# Altium footprint library 3.22-杂项.PcbLib: 985 footprints (part 61 of 64)
Each footprint in its own frame and in the unit in brackets; x right, y up, seen from the top. Pads: shape width x height; smd on the part's side, far side on the other; paste and mask are expansions set on the pad; w line width, h text height; cw(c..) or ccw(c..) is an arc to the next point about the centre after c.
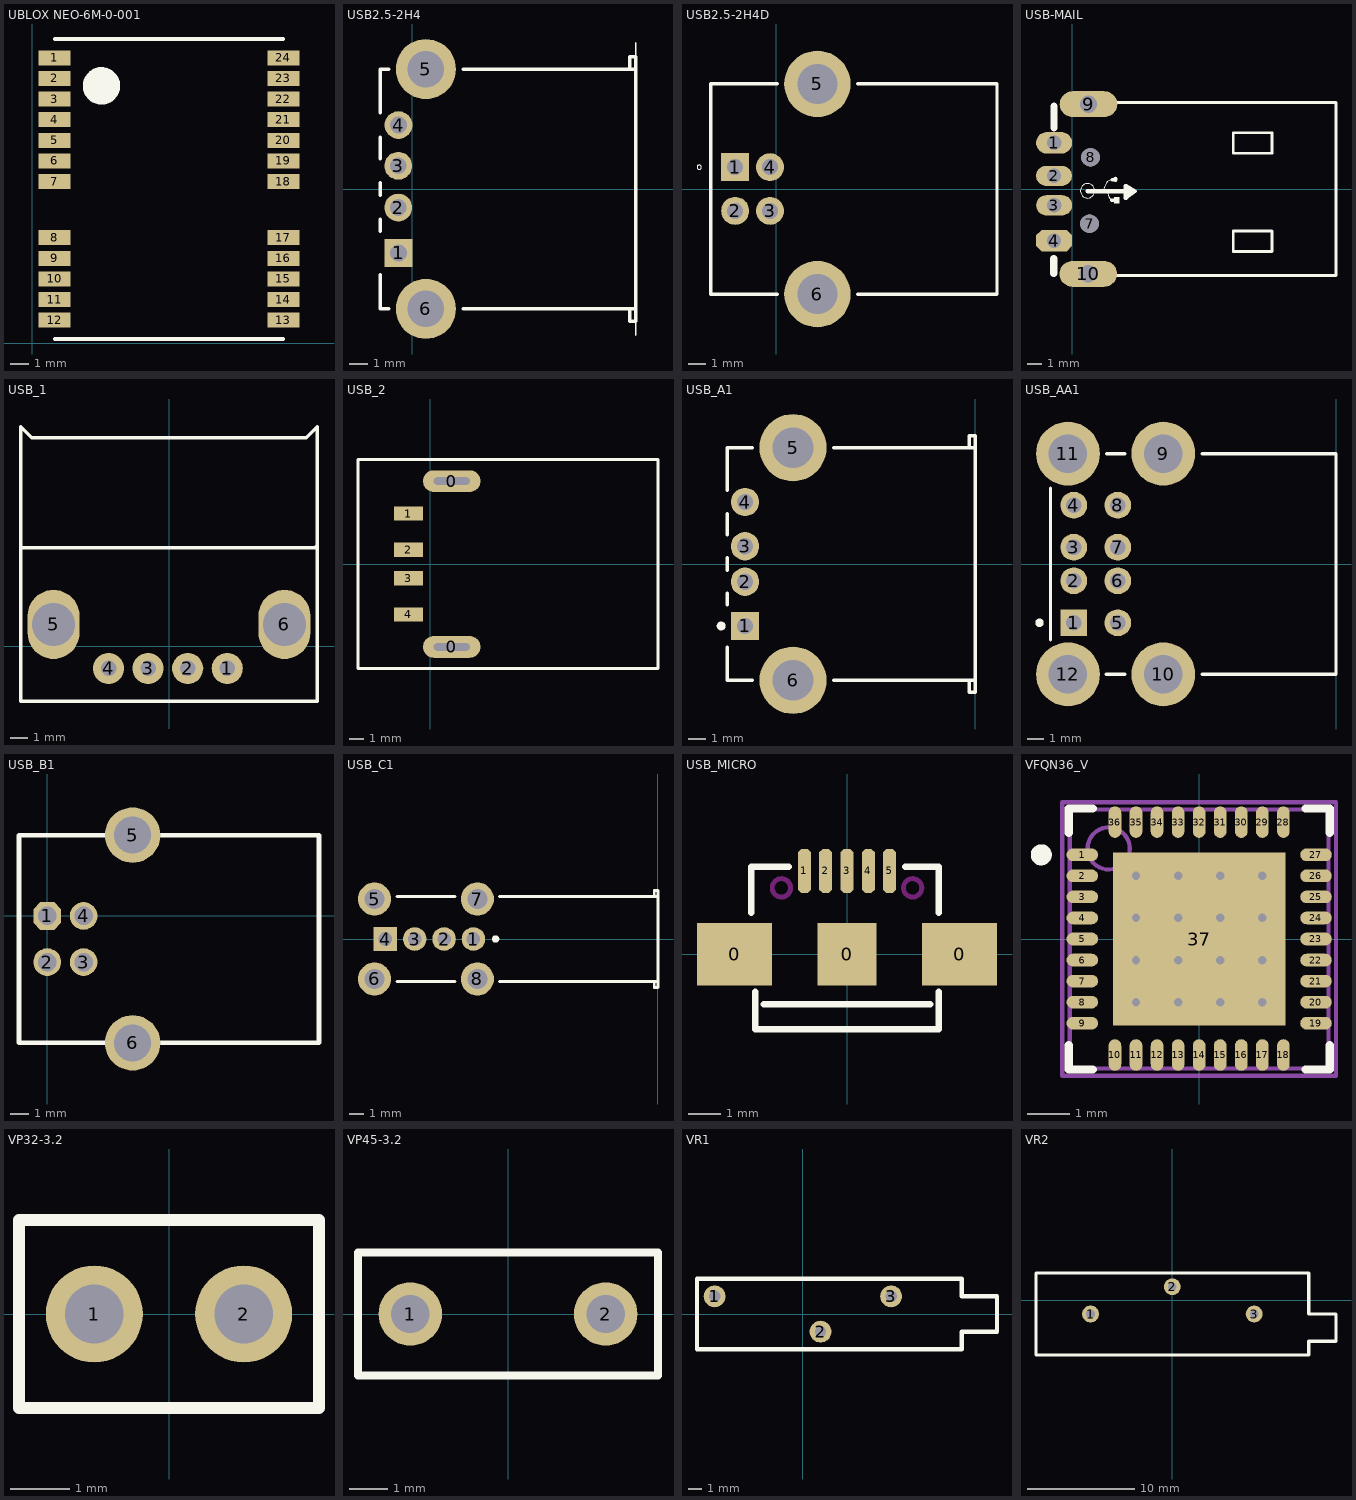
[diagram p60: the footprints below, top view; thin cyan lines are the x and y axes]

## UBLOX NEO-6M-0-001 [mm]
pads (24):
  rect 1.7x0.8 smd: 1(1.199,15.223) 2(1.199,14.123) 3(1.199,13.023) 4(1.199,11.923) 5(1.199,10.823) 6(1.199,9.723) 7(1.199,8.623) 8(1.199,5.623) 9(1.199,4.523) 10(1.199,3.423) 11(1.199,2.323) 12(1.199,1.223) 13(13.399,1.223) 14(13.399,2.323) 15(13.399,3.423) 16(13.399,4.523) 17(13.399,5.623) 18(13.399,8.623) 19(13.399,9.723) 20(13.399,10.823) 21(13.399,11.923) 22(13.399,13.023) 23(13.399,14.123) 24(13.399,15.223)
Top Overlay:
  circle w1: c3.699,13.723 r0.5
  lines w0.2: 1.199,0.223 13.399,0.223 ; 1.199,16.223 13.399,16.223
3D body: height 2.4, standoff 0.82, extent 2.199,1.223 12.399,15.223
3D body: height 0.82, standoff 0.01, extent 1.199,0.223 13.399,16.223

## USB2.5-2H4 [mm]
pads (6):
  rect 1.524x1.524 hole 0.92: 1(-0.75,-3.5)
  round 1.524 hole 0.92: 2(-0.762,-1.016) 3(-0.762,1.27) 4(-0.75,3.5)
  round 3.3 hole 2: 5(0.75,6.57) 6(0.75,-6.57)
Top Overlay:
  lines w0.1: 12.25,-8 12.25,8
  lines w0.2: -1.75,-4.7 -1.75,-6.565 -1.3,-6.565 ; -1.75,-2.3 -1.75,-1.67 ; -1.75,-0.33 -1.75,0.33 ; -1.75,1.67 -1.75,2.83 ; -1.75,4.17 -1.75,6.565 -1.3,6.565 ; 2.8,-6.565 12.25,-6.565 ; 2.8,6.565 12.25,6.565 ; 11.93,-6.565 11.93,-7.25 12.25,-7.25 12.25,-6.565 ; 11.93,6.565 11.93,7.25 12.25,7.25 12.25,6.565 ; 12.25,-6.565 12.25,6.565

## USB2.5-2H4D [mm]
pads (6):
  rect 1.6x1.6 hole 0.92: 1(-2.355,1.25)
  round 1.6 hole 0.92: 2(-2.355,-1.25) 3(-0.355,-1.25) 4(-0.355,1.25)
  round 3.8 hole 2.3: 5(2.355,6.02) 6(2.355,-6.02)
Top Overlay:
  circle w0.025: c-4.415,1.25 r0.125
  lines w0.2: 0.055,-6.02 -3.765,-6.02 -3.765,6.02 0.055,6.02 ; 4.655,-6.02 12.635,-6.02 12.635,6.02 4.655,6.02

## USB-MAIL [mm]
pads (8):
  oval 2.5x1.5 hole 1: 1(-1.26,3.202)
  oval 2.5x1.4 hole 1: 2(-1.266,0.909) 3(-1.254,-1.129)
  oct 2.5x1.5 hole 1: 4(-1.266,-3.581)
  round 1.27 hole 1.3: 7(1.198,-2.41) 8(1.266,2.194)
  oval 4x1.8 hole 1.2: 9(1.127,5.886) 10(1.113,-5.886)
Top Overlay:
  circle w0.025: c2.988,0.672 r0.127
  circle w0.025: c2.988,0.634 r0
  circle w0.025: c1.065,-0.128 r0.5
  rectangle: 2.886,-0.992 3.267,-0.56
  lines w0.025: 2.175,-0.154 cw(c3.095,-0.154) 2.444,0.497 cw(c2.775,0.166) 2.775,0.634 ; 2.454,-0.154 ccw(c3.313,-0.154) 2.706,-0.761
  lines w0.2: -0.438,-6.331 2.635,-6.331 ; -0.438,-6.306 -0.438,-5.493 2.635,-5.493 2.635,-6.306 ; -0.413,5.429 2.661,5.429 ; -0.413,5.455 -0.413,6.267 2.661,6.267 2.661,5.455 ; 0.298,-6.006 18.298,-6.006 18.298,5.994 0.298,5.994 ; 11.17,-4.324 13.862,-4.324 13.862,-2.902 11.17,-2.902 11.17,-4.324 ; 11.17,2.483 13.862,2.483 13.862,3.905 11.17,3.905 11.17,2.483
  lines w0.254: 1.057,-0.128 1.083,-0.154 ; 2.759,-0.789 2.959,-0.789 ; 2.775,0.634 2.988,0.634 ; 3.673,-0.636 3.673,-0.154 3.673,0.227 ; 3.724,-0.636 4.359,-0.154 3.724,0.227 ; 3.75,0.126 3.851,-0.357 3.775,-0.306 ; 4.258,-0.154 4.308,-0.154
  lines w0.3: 1.083,-0.154 4.308,-0.154
  lines w0.5: -1.288,-5.866 -1.288,-4.824 ; -1.263,4.243 -1.263,5.742

## USB_1 [mm]
height 7.62
pads (6):
  round 1.8 hole 0.9: 1(3.365,-1.27) 2(1.079,-1.27) 3(-1.206,-1.27) 4(-3.492,-1.27)
  oval 3x4 hole 2.5: 5(-6.667,1.27) 6(6.667,1.27)
Top Overlay:
  lines w0.203: -8.445,5.715 8.445,5.715 8.572,5.842 ; -8.572,-3.175 -8.572,-2.54 -8.572,12.7 -7.938,12.065 7.938,12.065 8.572,12.7 8.572,-2.54 8.572,-3.175 -8.572,-3.175

## USB_2 [mm]
pads (6):
  oval 4x1.5 hole 0.5 slot 2.5 at 0 deg: 0(1.5,-5.75) 0(1.5,5.75)
  rect 2x1 smd: 1(-1.5,3.5) 2(-1.5,1) 3(-1.5,-1) 4(-1.5,-3.5)
Top Overlay:
  lines w0.2: -5,-7.25 -5,7.25 15.8,7.25 15.8,-7.25 -5,-7.25

## USB_A1 [mm]
height 7.01
pads (6):
  rect 1.6x1.6 hole 0.92: 1(-12.99,-3.5)
  round 1.6 hole 0.92: 2(-12.99,-1) 3(-12.99,1) 4(-12.99,3.5)
  round 3.8 hole 2.3: 5(-10.28,6.57) 6(-10.28,-6.57)
Top Overlay:
  circle w0.25: c-14.34,-3.5 r0.125
  lines w0.2: -14,-4.7 -14,-6.565 -12.58,-6.565 ; -14,-2.3 -14,-1.66 ; -14,-0.34 -14,0.34 ; -14,1.66 -14,2.84 ; -14,4.16 -14,6.565 -12.58,6.565 ; -7.98,-6.565 0,-6.565 ; -7.98,6.565 0,6.565 ; -0.32,-6.565 -0.32,-7.25 0,-7.25 0,-6.565 ; -0.32,6.565 -0.32,7.25 0,7.25 0,6.565 ; 0,-6.565 0,6.565

## USB_AA1 [mm] "USB母座A型"
height 15.51
pads (12):
  rect 1.6x1.6 hole 0.92: 1(-15.61,-3.5)
  round 1.6 hole 0.92: 2(-15.61,-1) 3(-15.61,1) 4(-15.61,3.5) 5(-12.99,-3.5) 6(-12.99,-1) 7(-12.99,1) 8(-12.99,3.5)
  round 3.8 hole 2.3: 9(-10.28,6.57) 10(-10.28,-6.57) 11(-15.96,6.57) 12(-15.96,-6.57)
Top Overlay:
  circle w0.25: c-17.65,-3.5 r0.125
  lines w0.2: -17,-4.51 -17,4.51 ; -13.68,-6.565 -12.58,-6.565 ; -13.66,6.565 -12.58,6.565 ; -7.97,-6.565 0,-6.565 0,6.565 -7.97,6.565

## USB_B1 [mil] "USB方孔"
height 314.96
pads (6):
  oct 60x60 hole 40: 1(0,0)
  round 60 hole 40: 2(0,-100) 3(78.74,-100) 4(78.74,0)
  round 120 hole 80: 5(185.04,175) 6(185.04,-275)
Top Overlay:
  lines w10: -61.26,-275 588.74,-275 588.74,175 -61.26,175 -61.26,-275

## USB_C1 [mm] "侧卧USB"
height 13.83
pads (8):
  round 1.6 hole 0.92: 1(-12.56,0) 2(-14.56,0) 3(-16.56,0)
  rect 1.6x1.6 hole 0.92: 4(-18.56,0)
  round 2.25 hole 1.35: 5(-19.29,2.72) 6(-19.29,-2.72) 7(-12.29,2.72) 8(-12.29,-2.72)
Top Overlay:
  circle w0.25: c-11.047,0 r0.125
  lines w0.2: -17.773,-2.88 -13.807,-2.88 ; -17.773,2.88 -13.807,2.88 ; -10.773,-2.88 0,-2.88 ; -10.773,2.88 0,2.88 ; -0.254,-2.88 -0.254,-3.302 0,-3.302 0,-2.88 ; -0.254,2.88 -0.254,3.302 0,3.302 0,2.88 ; 0,-2.88 0,2.88

## USB_MICRO [mm] "USB方孔"
height 8
pads (8):
  rect 2.286x1.9 smd: 0(-3.429,0) 0(3.429,0)
  rect 1.8x1.9 smd: 0(0,0)
  oct 0.4x1.35 smd: 1(-1.3,2.54) 2(-0.65,2.54) 3(0,2.54) 4(0.65,2.54) 5(1.3,2.54)
Top Overlay:
  lines w0.2: -2.921,1.27 -2.921,2.667 -1.778,2.667 ; -2.794,-1.143 -2.794,-2.286 2.794,-2.286 2.794,-1.143 ; -2.54,-1.524 2.54,-1.524 ; 1.778,2.667 2.794,2.667 2.794,1.27
Keep-Out Layer:
  circle w0.15: c2,2.023 r0.28
  circle w0.15: c-2,2.023 r0.28

## VFQN36_V [mm] "QFN, 36-Leads, Body 6x6mm, Pitch 0.5mm, ST Recommended"
height 1
pads (37):
  oval 0.75x0.3 smd: 1(-2.775,2) 2(-2.775,1.5) 3(-2.775,1) 4(-2.775,0.5) 5(-2.775,0) 6(-2.775,-0.5) 7(-2.775,-1) 8(-2.775,-1.5) 9(-2.775,-2) 19(2.775,-2) 20(2.775,-1.5) 21(2.775,-1) 22(2.775,-0.5) 23(2.775,0) 24(2.775,0.5) 25(2.775,1) 26(2.775,1.5) 27(2.775,2)
  oval 0.3x0.75 smd: 10(-2,-2.755) 11(-1.5,-2.755) 12(-1,-2.755) 13(-0.5,-2.755) 14(0,-2.755) 15(0.5,-2.755) 16(1,-2.755) 17(1.5,-2.755) 18(2,-2.755) 28(2,2.775) 29(1.5,2.775) 30(1,2.775) 31(0.5,2.775) 32(0,2.775) 33(-0.5,2.775) 34(-1,2.775) 35(-1.5,2.775) 36(-2,2.775)
  rect 4.1x4.1 smd: 37(0,0)
via -1.5,1.5 diameter 0.4 hole 0.2
via -0.5,1.5 diameter 0.4 hole 0.2
via 0.5,1.5 diameter 0.4 hole 0.2
via 1.5,1.5 diameter 0.4 hole 0.2
via -1.5,0.5 diameter 0.4 hole 0.2
via -0.5,0.5 diameter 0.4 hole 0.2
via 0.5,0.5 diameter 0.4 hole 0.2
via 1.5,0.5 diameter 0.4 hole 0.2
via -1.5,-0.5 diameter 0.4 hole 0.2
via -0.5,-0.5 diameter 0.4 hole 0.2
via 0.5,-0.5 diameter 0.4 hole 0.2
via 1.5,-0.5 diameter 0.4 hole 0.2
via -1.5,-1.5 diameter 0.4 hole 0.2
via -0.5,-1.5 diameter 0.4 hole 0.2
via 0.5,-1.5 diameter 0.4 hole 0.2
via 1.5,-1.5 diameter 0.4 hole 0.2
Top Overlay:
  circle w0.25: c-3.75,2 r0.125
  lines w0.2: -3.1,-2.525 -3.1,-3.1 -2.525,-3.1 ; -3.1,2.525 -3.1,3.1 -2.525,3.1 ; 2.525,-3.1 3.1,-3.1 3.1,-2.525 ; 2.525,3.1 3.1,3.1 3.1,2.525
Mechanical 13:
  circle w0.1: c-2.15,2.15 r0.5
  lines w0.1: -3.075,3.05 -3.075,-3.075 3.075,-3.075 3.075,3.075 -3.075,3.075
Mechanical 15:
  lines w0.1: -0.5,0 0.5,0 ; 0,-0.5 0,0.5 ; -3.25,-3.25 -3.25,3.25 3.25,3.25 3.25,-3.25 -3.25,-3.25
3D body: height 1, standoff 0, extent -3.05,-3.05 3.05,3.05

## VP32-3.2 [mm] "Capacitor, Ceramic, Thru-Hole, Dipped Radial; Body 5.1 x 3.2 mm (WxT) Pin Spacing 2.54 mm (typ)"
height 6
pads (2):
  round 1.65 hole 1: 1(-1.27,0) 2(1.27,0)
Top Overlay:
  lines w0.2: -2.55,-1.6 2.55,-1.6 2.55,1.6 -2.55,1.6 -2.55,-1.6

## VP45-3.2 [mm] "Capacitor, Ceramic, Thru-Hole, Dipped Radial; Body 7.8 x 3.2 mm (WxT) Pin Spacing 5.08 mm (typ)"
height 6
pads (2):
  round 1.65 hole 1: 1(-2.54,0) 2(2.54,0)
Top Overlay:
  lines w0.2: -3.9,-1.6 -3.9,1.6 3.9,1.6 3.9,-1.6 -3.9,-1.6

## VR1 [mil]
pads (3):
  round 62 hole 32: 1(-250,50) 2(50,-50) 3(250,50)
Top Overlay:
  lines w12: -300,-100 -300,100 450,100 450,50 550,50 550,-50 450,-50 450,-100 -300,-100

## VR2 [mil]
pads (3):
  round 62 hole 32: 1(-300,-50) 2(0,50) 3(300,-50)
Top Overlay:
  lines w12: -500,-200 500,-200 500,-150 600,-150 600,-50 500,-50 500,100 -500,100 -500,-200